# Altium footprint library PCBLIB.PcbLib: 775 footprints (part 3 of 49)
Each footprint in its own frame and in the unit in brackets; x right, y up, seen from the top. Pads: shape width x height; smd on the part's side, far side on the other; paste and mask are expansions set on the pad; w line width, h text height; cw(c..) or ccw(c..) is an arc to the next point about the centre after c.
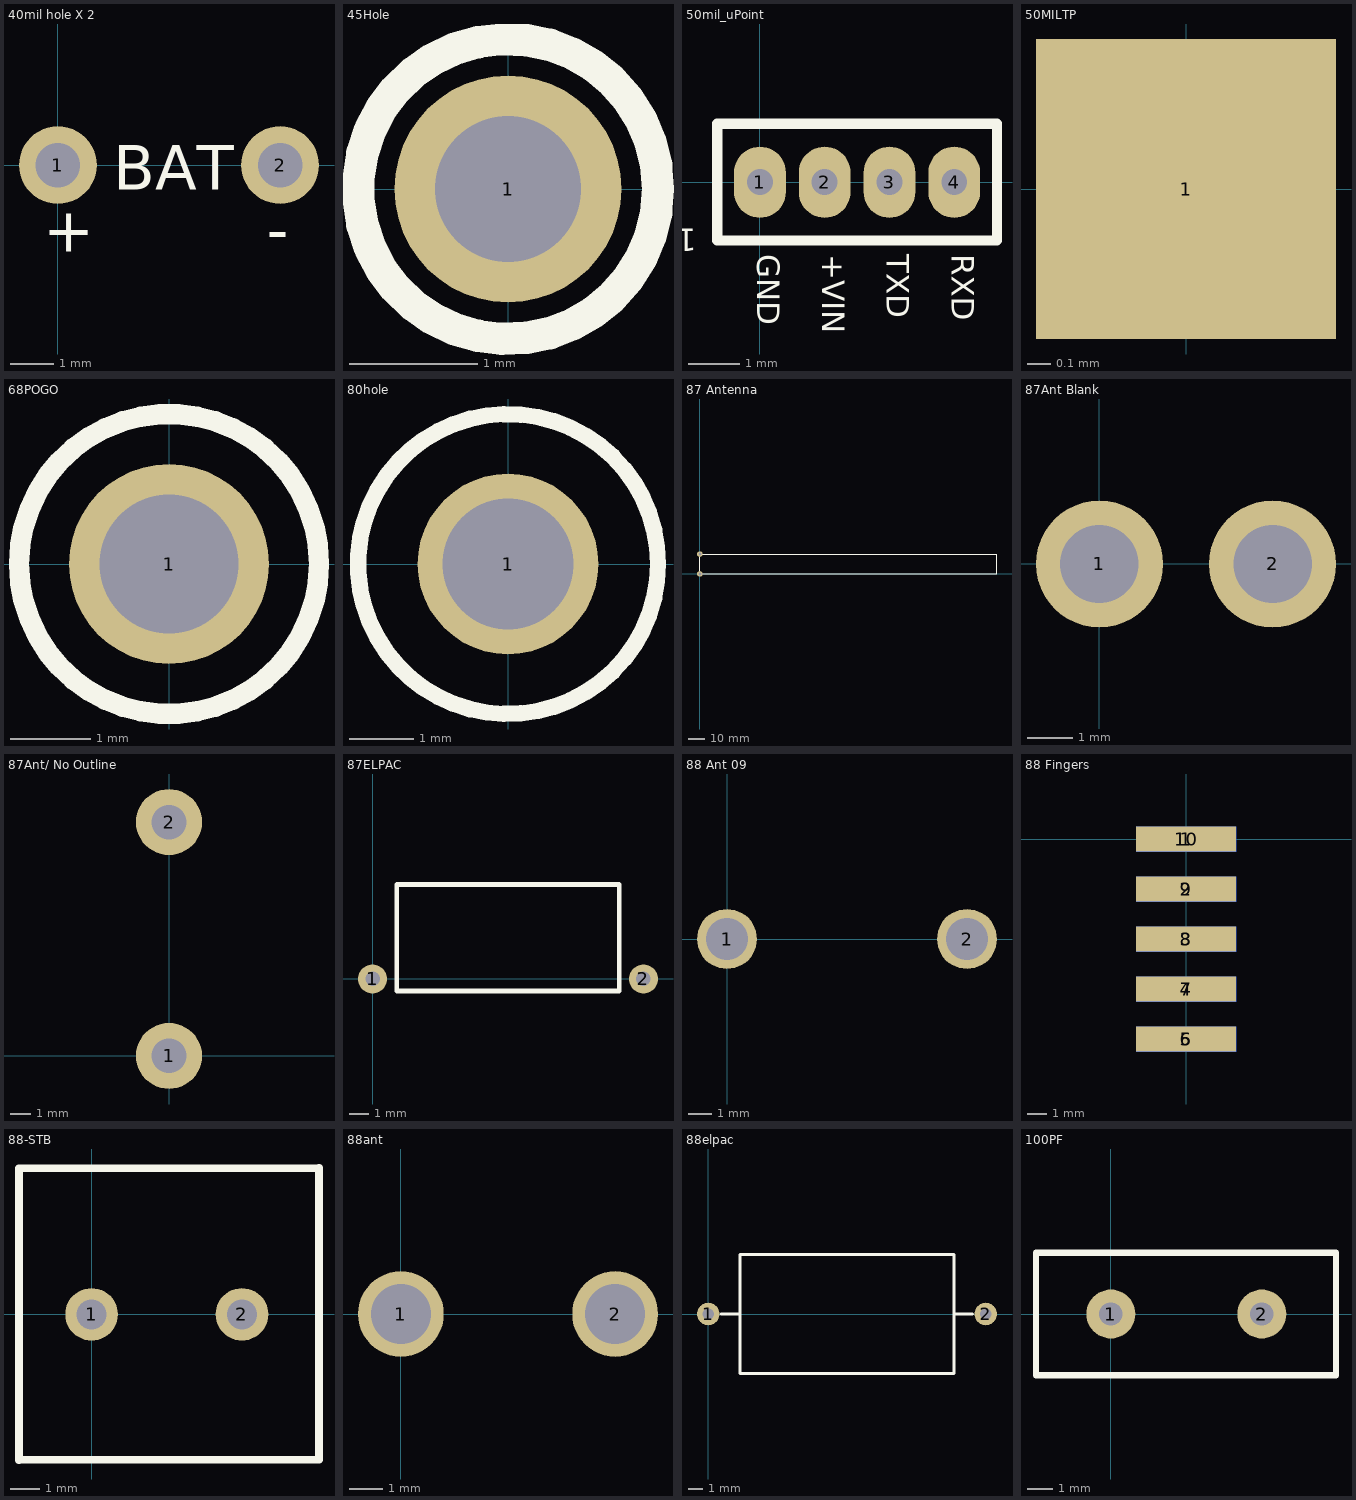
[diagram p2: the footprints below, top view; thin cyan lines are the x and y axes]

## 40mil hole X 2 [mil]
pads (2):
  round 70 hole 40: 1(0,0) 2(200,0)
TopOverlay:
  text "-" at 188,-78 h40
  text "+" at -13,-78 h40
  text "BAT" at 50,-22 h40

## 45Hole [mil]
pads (1):
  round 70 hole 45: 1(0,0)
TopOverlay:
  circle w10: c0,0 r46.23

## 50mil_uPoint [mil]
height 160
pads (4):
  oval 40x55 hole 20: 1(0,0) 2(50,0) 3(100,0) 4(150,0)
TopOverlay:
  lines w8: -33,-45 -33,45 183,45 183,-45 -33,-45
  text "1" at -48.56,-30.23 h30
  text "GND" at -7.76,-55.5 h30
  text "+VIN" at 42.24,-55.5 h30
  text "TXD" at 92.24,-55.5 h30
  text "RXD" at 142.24,-55.5 h30

## 50MILTP [mil] "Test Point"
height 1
pads (1):
  rect 50x50 smd: 1(0,0)

## 68POGO [mil] "Hole for a springloaded pogo pin SIZE 68mil"
pads (1):
  round 98 hole 68: 1(0,0)
TopOverlay:
  circle w10: c0,0 r73.5

## 80hole [mil]
pads (1):
  round 110 hole 80: 1(0,0)
TopOverlay:
  circle w10: c0,0 r91.3
Mechanical4:
  text ".005" at 0,0 h1

## 87 Antenna [mil]
pads (2):
  round 130 hole 68: 1(0,0) 2(0,460)
TopOverlay:
  lines w10: 0,0 6900,0 6900,460 0,460 0,0

## 87Ant Blank [mil]
height 420
pads (2):
  round 110 hole 68: 1(0,0) 2(150,0)

## 87Ant/ No Outline [mil]
height 420
pads (2):
  round 130 hole 68: 1(0,0) 2(0,460)

## 87ELPAC [mil]
height 325
pads (2):
  round 60 hole 30: 1(0,0) 2(560,0)
TopOverlay:
  lines w10: 50,-25 510,-25 510,195 50,195 50,-25

## 88 Ant 09 [mil]
pads (2):
  round 100 hole 70: 1(0,0) 2(400,0)

## 88 Fingers [mil]
pads (10):
  rect 200x50 smd: 1(0,0) 2(0,-100) 3(0,-200) 4(0,-300) 5(0,-400)
  rect 200x50 smd far side: 6(0,-400) 7(0,-300) 8(0,-200) 9(0,-100) 10(0,0)

## 88-STB [mil]
pads (2):
  round 70 hole 40: 1(0,0) 2(199.8,0)
TopOverlay:
  lines w10: -96.46,-193.9 -96.46,193.9 301.18,193.9 302.17,194.88 302.17,-192.91 -95.47,-192.91

## 88ant [mil]
pads (2):
  round 100 hole 70: 1(0,0) 2(250,0)

## 88elpac [mil]
height 325
pads (2):
  round 60 hole 30: 1(0,0) 2(739,0)
TopOverlay:
  lines w8: 34,0 84,0 ; 654,0 704,0 ; 84,-158 84,158 654,158 654,-158 84,-158

## 100PF [mil]
pads (2):
  round 76 hole 36: 1(0,0) 2(234,0)
TopOverlay:
  lines w10: -6,95 229,95 289,95 349,95 349,60 349,-60 349,-95 294,-95 234,-95 -1,-95 -61,-95 -116,-95 -116,-60 -116,60 -116,95 -61,95 -1,95